# Altium footprint library LM2596 Module.PcbLib: 1 footprints
Each footprint in its own frame and in the unit in brackets; x right, y up, seen from the top. Pads: shape width x height; smd on the part's side, far side on the other; paste and mask are expansions set on the pad; w line width, h text height; cw(c..) or ccw(c..) is an arc to the next point about the centre after c.
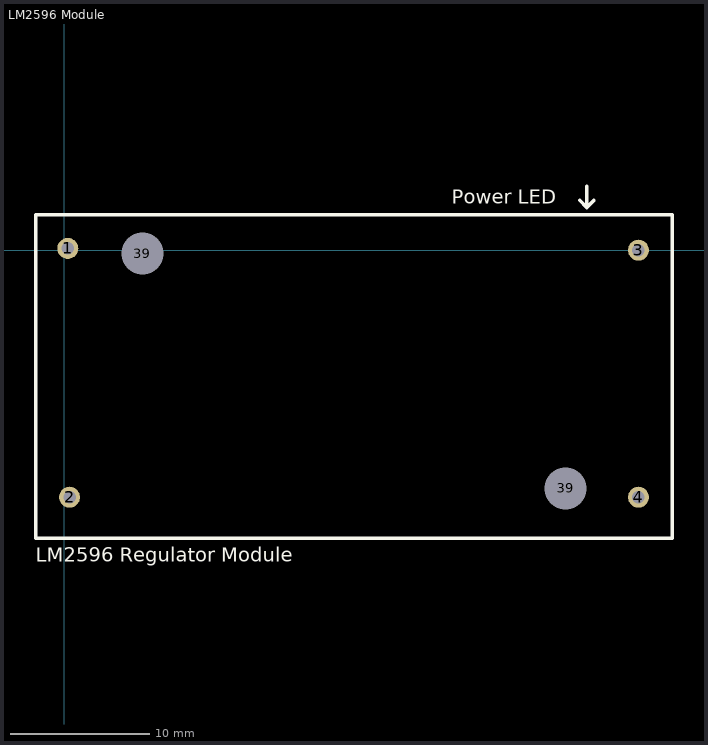
[diagram p0: the footprint, top view; thin cyan lines are the x and y axes]

## LM2596 Module [mil] "LM2596 Regulator Module"
pads (6):
  round 59.06 hole 35.43: 1(10,5) 2(15,-695) 3(1615,0) 4(1615,-695)
  round 60 hole 118.11: 39(220,-10) 39(1410,-670)
Top Overlay:
  lines w10: 1450,140 1470,120 ; 1470,180 1470,120 ; 1490,140 1470,120 ; -80,-810 -80,100 1710,100 1710,-810 -80,-810
  text "LM2596 Regulator Module" at -80,-876.67 h40
  text "Power LED" at 1090,130 h40
3D body "YAAJ_DCDC_StepDown_LM2596_PinHeaders_cp.step": height 661.42, standoff -118.11, extent -45,-765 1671.54,73.58